# Altium footprint library SMD IC Packages.PcbLib: 345 footprints (part 26 of 36)
Each footprint in its own frame and in the unit in brackets; x right, y up, seen from the top. Pads: shape width x height; smd on the part's side, far side on the other; paste and mask are expansions set on the pad; w line width, h text height; cw(c..) or ccw(c..) is an arc to the next point about the centre after c.
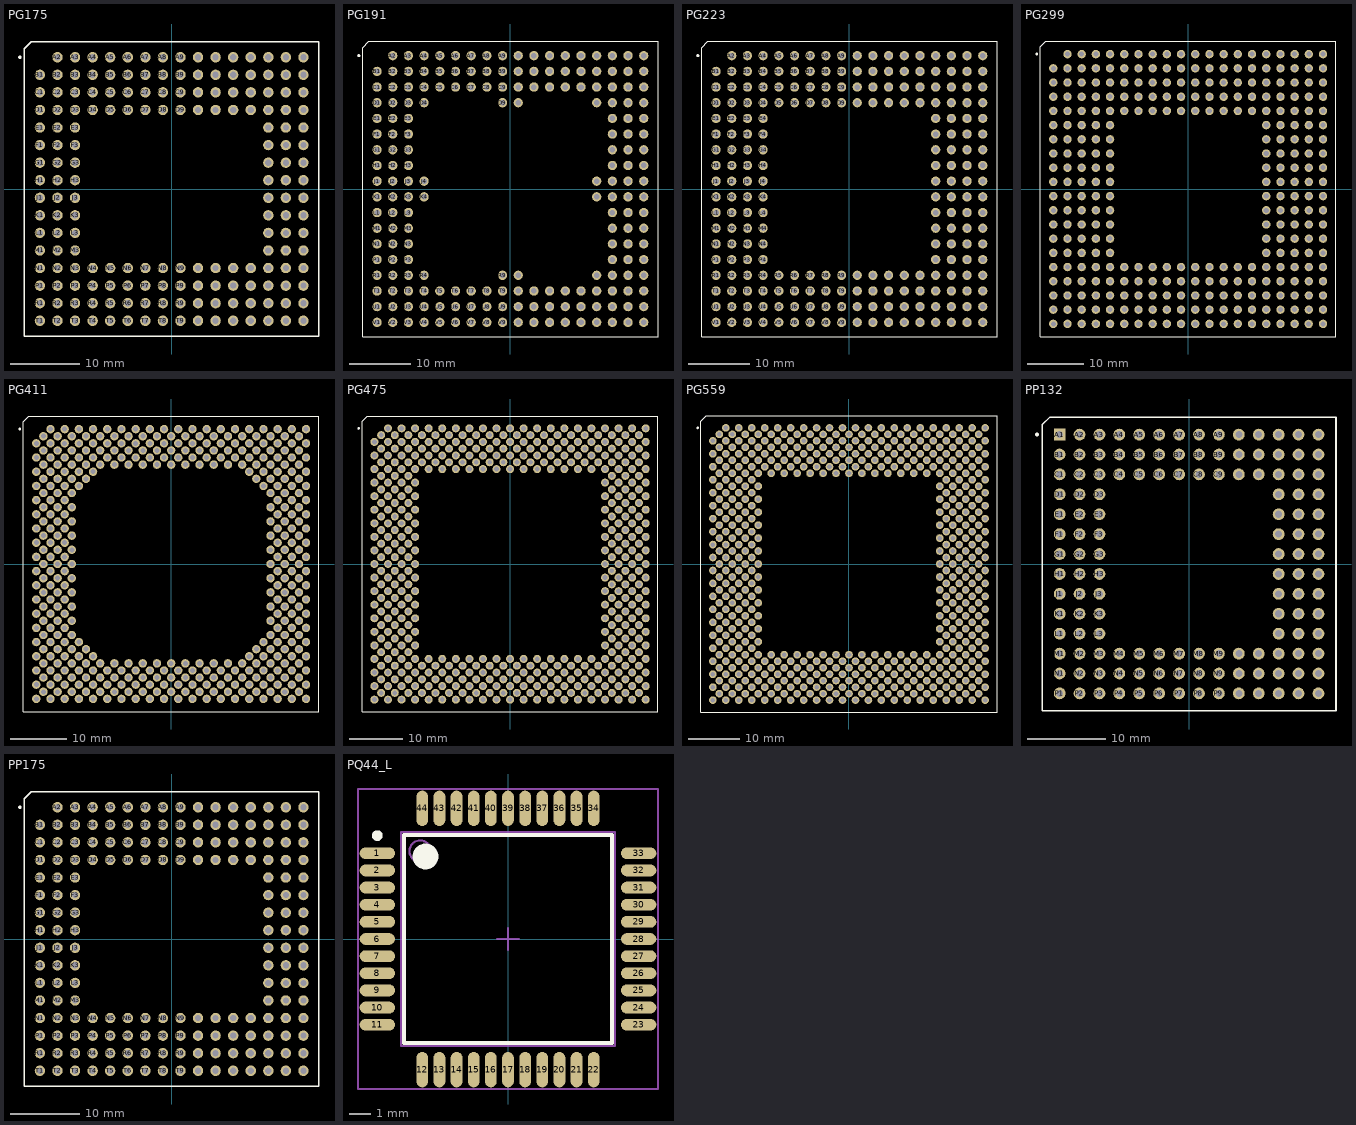
[diagram p25: the footprints below, top view; thin cyan lines are the x and y axes]

## PG175 [mm] "175-Pin Ceramic Pin Grid Array (PG175)"
height 5.21
pads (175):
  round 1.5 hole 0.9: A2(-16.51,19.05) A3(-13.97,19.05) A4(-11.43,19.05) A5(-8.89,19.05) A6(-6.35,19.05) A7(-3.81,19.05) A8(-1.27,19.05) A9(1.27,19.05) A10(3.81,19.05) A11(6.35,19.05) A12(8.89,19.05) A13(11.43,19.05) A14(13.97,19.05) A15(16.51,19.05) A16(19.05,19.05) B1(-19.05,16.51) B2(-16.51,16.51) B3(-13.97,16.51) B4(-11.43,16.51) B5(-8.89,16.51) B6(-6.35,16.51) B7(-3.81,16.51) B8(-1.27,16.51) B9(1.27,16.51) B10(3.81,16.51) B11(6.35,16.51) B12(8.89,16.51) B13(11.43,16.51) B14(13.97,16.51) B15(16.51,16.51) B16(19.05,16.51) C1(-19.05,13.97) C2(-16.51,13.97) C3(-13.97,13.97) C4(-11.43,13.97) C5(-8.89,13.97) C6(-6.35,13.97) C7(-3.81,13.97) C8(-1.27,13.97) C9(1.27,13.97) C10(3.81,13.97) C11(6.35,13.97) C12(8.89,13.97) C13(11.43,13.97) C14(13.97,13.97) C15(16.51,13.97) C16(19.05,13.97) D1(-19.05,11.43) D2(-16.51,11.43) D3(-13.97,11.43) D4(-11.43,11.43) D5(-8.89,11.43) D6(-6.35,11.43) D7(-3.81,11.43) D8(-1.27,11.43) D9(1.27,11.43) D10(3.81,11.43) D11(6.35,11.43) D12(8.89,11.43) D13(11.43,11.43) D14(13.97,11.43) D15(16.51,11.43) D16(19.05,11.43) E1(-19.05,8.89) E2(-16.51,8.89) E3(-13.97,8.89) E14(13.97,8.89) E15(16.51,8.89) E16(19.05,8.89) F1(-19.05,6.35) F2(-16.51,6.35) F3(-13.97,6.35) F14(13.97,6.35) F15(16.51,6.35) F16(19.05,6.35) G1(-19.05,3.81) G2(-16.51,3.81) G3(-13.97,3.81) G14(13.97,3.81) G15(16.51,3.81) G16(19.05,3.81) H1(-19.05,1.27) H2(-16.51,1.27) H3(-13.97,1.27) H14(13.97,1.27) H15(16.51,1.27) H16(19.05,1.27) J1(-19.05,-1.27) J2(-16.51,-1.27) J3(-13.97,-1.27) J14(13.97,-1.27) J15(16.51,-1.27) J16(19.05,-1.27) K1(-19.05,-3.81) K2(-16.51,-3.81) K3(-13.97,-3.81) K14(13.97,-3.81) K15(16.51,-3.81) K16(19.05,-3.81) L1(-19.05,-6.35) L2(-16.51,-6.35) L3(-13.97,-6.35) L14(13.97,-6.35) L15(16.51,-6.35) L16(19.05,-6.35) M1(-19.05,-8.89) M2(-16.51,-8.89) M3(-13.97,-8.89) M14(13.97,-8.89) M15(16.51,-8.89) M16(19.05,-8.89) N1(-19.05,-11.43) N2(-16.51,-11.43) N3(-13.97,-11.43) N4(-11.43,-11.43) N5(-8.89,-11.43) N6(-6.35,-11.43) N7(-3.81,-11.43) N8(-1.27,-11.43) N9(1.27,-11.43) N10(3.81,-11.43) N11(6.35,-11.43) N12(8.89,-11.43) N13(11.43,-11.43) N14(13.97,-11.43) N15(16.51,-11.43) N16(19.05,-11.43) P1(-19.05,-13.97) P2(-16.51,-13.97) P3(-13.97,-13.97) P4(-11.43,-13.97) P5(-8.89,-13.97) P6(-6.35,-13.97) P7(-3.81,-13.97) P8(-1.27,-13.97) P9(1.27,-13.97) P10(3.81,-13.97) P11(6.35,-13.97) P12(8.89,-13.97) P13(11.43,-13.97) P14(13.97,-13.97) P15(16.51,-13.97) P16(19.05,-13.97) R1(-19.05,-16.51) R2(-16.51,-16.51) R3(-13.97,-16.51) R4(-11.43,-16.51) R5(-8.89,-16.51) R6(-6.35,-16.51) R7(-3.81,-16.51) R8(-1.27,-16.51) R9(1.27,-16.51) R10(3.81,-16.51) R11(6.35,-16.51) R12(8.89,-16.51) R13(11.43,-16.51) R14(13.97,-16.51) R15(16.51,-16.51) R16(19.05,-16.51) T1(-19.05,-19.05) T2(-16.51,-19.05) T3(-13.97,-19.05) T4(-11.43,-19.05) T5(-8.89,-19.05) T6(-6.35,-19.05) T7(-3.81,-19.05) T8(-1.27,-19.05) T9(1.27,-19.05) T10(3.81,-19.05) T11(6.35,-19.05) T12(8.89,-19.05) T13(11.43,-19.05) T14(13.97,-19.05) T15(16.51,-19.05) T16(19.05,-19.05)
Top Overlay:
  circle w0.25: c-21.95,19.05 r0.125
  lines w0.2: -21.3,-21.3 -21.3,20.3 -20.3,21.3 21.3,21.3 21.3,-21.3 -21.3,-21.3

## PG191 [mm] "191-Pin Ceramic Pin Grid Array (PG191)"
height 5.21
pads (191):
  round 1.5 hole 0.9: A2(-19.05,21.59) A3(-16.51,21.59) A4(-13.97,21.59) A5(-11.43,21.59) A6(-8.89,21.59) A7(-6.35,21.59) A8(-3.81,21.59) A9(-1.27,21.59) A10(1.27,21.59) A11(3.81,21.59) A12(6.35,21.59) A13(8.89,21.59) A14(11.43,21.59) A15(13.97,21.59) A16(16.51,21.59) A17(19.05,21.59) A18(21.59,21.59) B1(-21.59,19.05) B2(-19.05,19.05) B3(-16.51,19.05) B4(-13.97,19.05) B5(-11.43,19.05) B6(-8.89,19.05) B7(-6.35,19.05) B8(-3.81,19.05) B9(-1.27,19.05) B10(1.27,19.05) B11(3.81,19.05) B12(6.35,19.05) B13(8.89,19.05) B14(11.43,19.05) B15(13.97,19.05) B16(16.51,19.05) B17(19.05,19.05) B18(21.59,19.05) C1(-21.59,16.51) C2(-19.05,16.51) C3(-16.51,16.51) C4(-13.97,16.51) C5(-11.43,16.51) C6(-8.89,16.51) C7(-6.35,16.51) C8(-3.81,16.51) C9(-1.27,16.51) C10(1.27,16.51) C11(3.81,16.51) C12(6.35,16.51) C13(8.89,16.51) C14(11.43,16.51) C15(13.97,16.51) C16(16.51,16.51) C17(19.05,16.51) C18(21.59,16.51) D1(-21.59,13.97) D2(-19.05,13.97) D3(-16.51,13.97) D4(-13.97,13.97) D9(-1.27,13.97) D10(1.27,13.97) D15(13.97,13.97) D16(16.51,13.97) D17(19.05,13.97) D18(21.59,13.97) E1(-21.59,11.43) E2(-19.05,11.43) E3(-16.51,11.43) E16(16.51,11.43) E17(19.05,11.43) E18(21.59,11.43) F1(-21.59,8.89) F2(-19.05,8.89) F3(-16.51,8.89) F16(16.51,8.89) F17(19.05,8.89) F18(21.59,8.89) G1(-21.59,6.35) G2(-19.05,6.35) G3(-16.51,6.35) G16(16.51,6.35) G17(19.05,6.35) G18(21.59,6.35) H1(-21.59,3.81) H2(-19.05,3.81) H3(-16.51,3.81) H16(16.51,3.81) H17(19.05,3.81) H18(21.59,3.81) J1(-21.59,1.27) J2(-19.05,1.27) J3(-16.51,1.27) J4(-13.97,1.27) J15(13.97,1.27) J16(16.51,1.27) J17(19.05,1.27) J18(21.59,1.27) K1(-21.59,-1.27) K2(-19.05,-1.27) K3(-16.51,-1.27) K4(-13.97,-1.27) K15(13.97,-1.27) K16(16.51,-1.27) K17(19.05,-1.27) K18(21.59,-1.27) L1(-21.59,-3.81) L2(-19.05,-3.81) L3(-16.51,-3.81) L16(16.51,-3.81) L17(19.05,-3.81) L18(21.59,-3.81) M1(-21.59,-6.35) M2(-19.05,-6.35) M3(-16.51,-6.35) M16(16.51,-6.35) M17(19.05,-6.35) M18(21.59,-6.35) N1(-21.59,-8.89) N2(-19.05,-8.89) N3(-16.51,-8.89) N16(16.51,-8.89) N17(19.05,-8.89) N18(21.59,-8.89) P1(-21.59,-11.43) P2(-19.05,-11.43) P3(-16.51,-11.43) P16(16.51,-11.43) P17(19.05,-11.43) P18(21.59,-11.43) R1(-21.59,-13.97) R2(-19.05,-13.97) R3(-16.51,-13.97) R4(-13.97,-13.97) R9(-1.27,-13.97) R10(1.27,-13.97) R15(13.97,-13.97) R16(16.51,-13.97) R17(19.05,-13.97) R18(21.59,-13.97) T1(-21.59,-16.51) T2(-19.05,-16.51) T3(-16.51,-16.51) T4(-13.97,-16.51) T5(-11.43,-16.51) T6(-8.89,-16.51) T7(-6.35,-16.51) T8(-3.81,-16.51) T9(-1.27,-16.51) T10(1.27,-16.51) T11(3.81,-16.51) T12(6.35,-16.51) T13(8.89,-16.51) T14(11.43,-16.51) T15(13.97,-16.51) T16(16.51,-16.51) T17(19.05,-16.51) T18(21.59,-16.51) U1(-21.59,-19.05) U2(-19.05,-19.05) U3(-16.51,-19.05) U4(-13.97,-19.05) U5(-11.43,-19.05) U6(-8.89,-19.05) U7(-6.35,-19.05) U8(-3.81,-19.05) U9(-1.27,-19.05) U10(1.27,-19.05) U11(3.81,-19.05) U12(6.35,-19.05) U13(8.89,-19.05) U14(11.43,-19.05) U15(13.97,-19.05) U16(16.51,-19.05) U17(19.05,-19.05) U18(21.59,-19.05) V1(-21.59,-21.59) V2(-19.05,-21.59) V3(-16.51,-21.59) V4(-13.97,-21.59) V5(-11.43,-21.59) V6(-8.89,-21.59) V7(-6.35,-21.59) V8(-3.81,-21.59) V9(-1.27,-21.59) V10(1.27,-21.59) V11(3.81,-21.59) V12(6.35,-21.59) V13(8.89,-21.59) V14(11.43,-21.59) V15(13.97,-21.59) V16(16.51,-21.59) V17(19.05,-21.59) V18(21.59,-21.59)
Top Overlay:
  circle w0.25: c-24.55,21.59 r0.125
  lines w0.2: -23.9,-23.9 23.9,-23.9 23.9,23.9 -22.9,23.9 -23.9,22.9 -23.9,-23.9

## PG223 [mm] "223-Pin Ceramic Pin Grid Array (PG223)"
height 5.21
pads (223):
  round 1.5 hole 0.9: A2(-19.05,21.59) A3(-16.51,21.59) A4(-13.97,21.59) A5(-11.43,21.59) A6(-8.89,21.59) A7(-6.35,21.59) A8(-3.81,21.59) A9(-1.27,21.59) A10(1.27,21.59) A11(3.81,21.59) A12(6.35,21.59) A13(8.89,21.59) A14(11.43,21.59) A15(13.97,21.59) A16(16.51,21.59) A17(19.05,21.59) A18(21.59,21.59) B1(-21.59,19.05) B2(-19.05,19.05) B3(-16.51,19.05) B4(-13.97,19.05) B5(-11.43,19.05) B6(-8.89,19.05) B7(-6.35,19.05) B8(-3.81,19.05) B9(-1.27,19.05) B10(1.27,19.05) B11(3.81,19.05) B12(6.35,19.05) B13(8.89,19.05) B14(11.43,19.05) B15(13.97,19.05) B16(16.51,19.05) B17(19.05,19.05) B18(21.59,19.05) C1(-21.59,16.51) C2(-19.05,16.51) C3(-16.51,16.51) C4(-13.97,16.51) C5(-11.43,16.51) C6(-8.89,16.51) C7(-6.35,16.51) C8(-3.81,16.51) C9(-1.27,16.51) C10(1.27,16.51) C11(3.81,16.51) C12(6.35,16.51) C13(8.89,16.51) C14(11.43,16.51) C15(13.97,16.51) C16(16.51,16.51) C17(19.05,16.51) C18(21.59,16.51) D1(-21.59,13.97) D2(-19.05,13.97) D3(-16.51,13.97) D4(-13.97,13.97) D5(-11.43,13.97) D6(-8.89,13.97) D7(-6.35,13.97) D8(-3.81,13.97) D9(-1.27,13.97) D10(1.27,13.97) D11(3.81,13.97) D12(6.35,13.97) D13(8.89,13.97) D14(11.43,13.97) D15(13.97,13.97) D16(16.51,13.97) D17(19.05,13.97) D18(21.59,13.97) E1(-21.59,11.43) E2(-19.05,11.43) E3(-16.51,11.43) E4(-13.97,11.43) E15(13.97,11.43) E16(16.51,11.43) E17(19.05,11.43) E18(21.59,11.43) F1(-21.59,8.89) F2(-19.05,8.89) F3(-16.51,8.89) F4(-13.97,8.89) F15(13.97,8.89) F16(16.51,8.89) F17(19.05,8.89) F18(21.59,8.89) G1(-21.59,6.35) G2(-19.05,6.35) G3(-16.51,6.35) G4(-13.97,6.35) G15(13.97,6.35) G16(16.51,6.35) G17(19.05,6.35) G18(21.59,6.35) H1(-21.59,3.81) H2(-19.05,3.81) H3(-16.51,3.81) H4(-13.97,3.81) H15(13.97,3.81) H16(16.51,3.81) H17(19.05,3.81) H18(21.59,3.81) J1(-21.59,1.27) J2(-19.05,1.27) J3(-16.51,1.27) J4(-13.97,1.27) J15(13.97,1.27) J16(16.51,1.27) J17(19.05,1.27) J18(21.59,1.27) K1(-21.59,-1.27) K2(-19.05,-1.27) K3(-16.51,-1.27) K4(-13.97,-1.27) K15(13.97,-1.27) K16(16.51,-1.27) K17(19.05,-1.27) K18(21.59,-1.27) L1(-21.59,-3.81) L2(-19.05,-3.81) L3(-16.51,-3.81) L4(-13.97,-3.81) L15(13.97,-3.81) L16(16.51,-3.81) L17(19.05,-3.81) L18(21.59,-3.81) M1(-21.59,-6.35) M2(-19.05,-6.35) M3(-16.51,-6.35) M4(-13.97,-6.35) M15(13.97,-6.35) M16(16.51,-6.35) M17(19.05,-6.35) M18(21.59,-6.35) N1(-21.59,-8.89) N2(-19.05,-8.89) N3(-16.51,-8.89) N4(-13.97,-8.89) N15(13.97,-8.89) N16(16.51,-8.89) N17(19.05,-8.89) N18(21.59,-8.89) P1(-21.59,-11.43) P2(-19.05,-11.43) P3(-16.51,-11.43) P4(-13.97,-11.43) P15(13.97,-11.43) P16(16.51,-11.43) P17(19.05,-11.43) P18(21.59,-11.43) R1(-21.59,-13.97) R2(-19.05,-13.97) R3(-16.51,-13.97) R4(-13.97,-13.97) R5(-11.43,-13.97) R6(-8.89,-13.97) R7(-6.35,-13.97) R8(-3.81,-13.97) R9(-1.27,-13.97) R10(1.27,-13.97) R11(3.81,-13.97) R12(6.35,-13.97) R13(8.89,-13.97) R14(11.43,-13.97) R15(13.97,-13.97) R16(16.51,-13.97) R17(19.05,-13.97) R18(21.59,-13.97) T1(-21.59,-16.51) T2(-19.05,-16.51) T3(-16.51,-16.51) T4(-13.97,-16.51) T5(-11.43,-16.51) T6(-8.89,-16.51) T7(-6.35,-16.51) T8(-3.81,-16.51) T9(-1.27,-16.51) T10(1.27,-16.51) T11(3.81,-16.51) T12(6.35,-16.51) T13(8.89,-16.51) T14(11.43,-16.51) T15(13.97,-16.51) T16(16.51,-16.51) T17(19.05,-16.51) T18(21.59,-16.51) U1(-21.59,-19.05) U2(-19.05,-19.05) U3(-16.51,-19.05) U4(-13.97,-19.05) U5(-11.43,-19.05) U6(-8.89,-19.05) U7(-6.35,-19.05) U8(-3.81,-19.05) U9(-1.27,-19.05) U10(1.27,-19.05) U11(3.81,-19.05) U12(6.35,-19.05) U13(8.89,-19.05) U14(11.43,-19.05) U15(13.97,-19.05) U16(16.51,-19.05) U17(19.05,-19.05) U18(21.59,-19.05) V1(-21.59,-21.59) V2(-19.05,-21.59) V3(-16.51,-21.59) V4(-13.97,-21.59) V5(-11.43,-21.59) V6(-8.89,-21.59) V7(-6.35,-21.59) V8(-3.81,-21.59) V9(-1.27,-21.59) V10(1.27,-21.59) V11(3.81,-21.59) V12(6.35,-21.59) V13(8.89,-21.59) V14(11.43,-21.59) V15(13.97,-21.59) V16(16.51,-21.59) V17(19.05,-21.59) V18(21.59,-21.59)
Top Overlay:
  circle w0.25: c-24.55,21.59 r0.125
  lines w0.2: -23.9,-23.9 23.9,-23.9 23.9,23.9 -22.9,23.9 -23.9,22.9 -23.9,-23.9

## PG299 [mm] "299-Pin Ceramic Pin Grid Array (PG299)"
height 5.21
pads (299):
  round 1.5 hole 0.9: A2(-21.59,24.13) A3(-19.05,24.13) A4(-16.51,24.13) A5(-13.97,24.13) A6(-11.43,24.13) A7(-8.89,24.13) A8(-6.35,24.13) A9(-3.81,24.13) A10(-1.27,24.13) A11(1.27,24.13) A12(3.81,24.13) A13(6.35,24.13) A14(8.89,24.13) A15(11.43,24.13) A16(13.97,24.13) A17(16.51,24.13) A18(19.05,24.13) A19(21.59,24.13) A20(24.13,24.13) B1(-24.13,21.59) B2(-21.59,21.59) B3(-19.05,21.59) B4(-16.51,21.59) B5(-13.97,21.59) B6(-11.43,21.59) B7(-8.89,21.59) B8(-6.35,21.59) B9(-3.81,21.59) B10(-1.27,21.59) B11(1.27,21.59) B12(3.81,21.59) B13(6.35,21.59) B14(8.89,21.59) B15(11.43,21.59) B16(13.97,21.59) B17(16.51,21.59) B18(19.05,21.59) B19(21.59,21.59) B20(24.13,21.59) C1(-24.13,19.05) C2(-21.59,19.05) C3(-19.05,19.05) C4(-16.51,19.05) C5(-13.97,19.05) C6(-11.43,19.05) C7(-8.89,19.05) C8(-6.35,19.05) C9(-3.81,19.05) C10(-1.27,19.05) C11(1.27,19.05) C12(3.81,19.05) C13(6.35,19.05) C14(8.89,19.05) C15(11.43,19.05) C16(13.97,19.05) C17(16.51,19.05) C18(19.05,19.05) C19(21.59,19.05) C20(24.13,19.05) D1(-24.13,16.51) D2(-21.59,16.51) D3(-19.05,16.51) D4(-16.51,16.51) D5(-13.97,16.51) D6(-11.43,16.51) D7(-8.89,16.51) D8(-6.35,16.51) D9(-3.81,16.51) D10(-1.27,16.51) D11(1.27,16.51) D12(3.81,16.51) D13(6.35,16.51) D14(8.89,16.51) D15(11.43,16.51) D16(13.97,16.51) D17(16.51,16.51) D18(19.05,16.51) D19(21.59,16.51) D20(24.13,16.51) E1(-24.13,13.97) E2(-21.59,13.97) E3(-19.05,13.97) E4(-16.51,13.97) E5(-13.97,13.97) E6(-11.43,13.97) E7(-8.89,13.97) E8(-6.35,13.97) E9(-3.81,13.97) E10(-1.27,13.97) E11(1.27,13.97) E12(3.81,13.97) E13(6.35,13.97) E14(8.89,13.97) E15(11.43,13.97) E16(13.97,13.97) E17(16.51,13.97) E18(19.05,13.97) E19(21.59,13.97) E20(24.13,13.97) F1(-24.13,11.43) F2(-21.59,11.43) F3(-19.05,11.43) F4(-16.51,11.43) F5(-13.97,11.43) F16(13.97,11.43) F17(16.51,11.43) F18(19.05,11.43) F19(21.59,11.43) F20(24.13,11.43) G1(-24.13,8.89) G2(-21.59,8.89) G3(-19.05,8.89) G4(-16.51,8.89) G5(-13.97,8.89) G16(13.97,8.89) G17(16.51,8.89) G18(19.05,8.89) G19(21.59,8.89) G20(24.13,8.89) H1(-24.13,6.35) H2(-21.59,6.35) H3(-19.05,6.35) H4(-16.51,6.35) H5(-13.97,6.35) H16(13.97,6.35) H17(16.51,6.35) H18(19.05,6.35) H19(21.59,6.35) H20(24.13,6.35) J1(-24.13,3.81) J2(-21.59,3.81) J3(-19.05,3.81) J4(-16.51,3.81) J5(-13.97,3.81) J16(13.97,3.81) J17(16.51,3.81) J18(19.05,3.81) J19(21.59,3.81) J20(24.13,3.81) K1(-24.13,1.27) K2(-21.59,1.27) K3(-19.05,1.27) K4(-16.51,1.27) K5(-13.97,1.27) K16(13.97,1.27) K17(16.51,1.27) K18(19.05,1.27) K19(21.59,1.27) K20(24.13,1.27) L1(-24.13,-1.27) L2(-21.59,-1.27) L3(-19.05,-1.27) L4(-16.51,-1.27) L5(-13.97,-1.27) L16(13.97,-1.27) L17(16.51,-1.27) L18(19.05,-1.27) L19(21.59,-1.27) L20(24.13,-1.27) M1(-24.13,-3.81) M2(-21.59,-3.81) M3(-19.05,-3.81) M4(-16.51,-3.81) M5(-13.97,-3.81) M16(13.97,-3.81) M17(16.51,-3.81) M18(19.05,-3.81) M19(21.59,-3.81) M20(24.13,-3.81) N1(-24.13,-6.35) N2(-21.59,-6.35) N3(-19.05,-6.35) N4(-16.51,-6.35) N5(-13.97,-6.35) N16(13.97,-6.35) N17(16.51,-6.35) N18(19.05,-6.35) N19(21.59,-6.35) N20(24.13,-6.35) P1(-24.13,-8.89) P2(-21.59,-8.89) P3(-19.05,-8.89) P4(-16.51,-8.89) P5(-13.97,-8.89) P16(13.97,-8.89) P17(16.51,-8.89) P18(19.05,-8.89) P19(21.59,-8.89) P20(24.13,-8.89) R1(-24.13,-11.43) R2(-21.59,-11.43) R3(-19.05,-11.43) R4(-16.51,-11.43) R5(-13.97,-11.43) R16(13.97,-11.43) R17(16.51,-11.43) R18(19.05,-11.43) R19(21.59,-11.43) R20(24.13,-11.43) T1(-24.13,-13.97) T2(-21.59,-13.97) T3(-19.05,-13.97) T4(-16.51,-13.97) T5(-13.97,-13.97) T6(-11.43,-13.97) T7(-8.89,-13.97) T8(-6.35,-13.97) T9(-3.81,-13.97) T10(-1.27,-13.97) T11(1.27,-13.97) T12(3.81,-13.97) T13(6.35,-13.97) T14(8.89,-13.97) T15(11.43,-13.97) T16(13.97,-13.97) T17(16.51,-13.97) T18(19.05,-13.97) T19(21.59,-13.97) T20(24.13,-13.97) U1(-24.13,-16.51) U2(-21.59,-16.51) U3(-19.05,-16.51) U4(-16.51,-16.51) U5(-13.97,-16.51) U6(-11.43,-16.51) U7(-8.89,-16.51) U8(-6.35,-16.51) U9(-3.81,-16.51) U10(-1.27,-16.51) U11(1.27,-16.51) U12(3.81,-16.51) U13(6.35,-16.51) U14(8.89,-16.51) U15(11.43,-16.51) U16(13.97,-16.51) U17(16.51,-16.51) U18(19.05,-16.51) U19(21.59,-16.51) U20(24.13,-16.51) V1(-24.13,-19.05) V2(-21.59,-19.05) V3(-19.05,-19.05) V4(-16.51,-19.05) V5(-13.97,-19.05) V6(-11.43,-19.05) V7(-8.89,-19.05) V8(-6.35,-19.05) V9(-3.81,-19.05) V10(-1.27,-19.05) V11(1.27,-19.05) V12(3.81,-19.05) V13(6.35,-19.05) V14(8.89,-19.05) V15(11.43,-19.05) V16(13.97,-19.05) V17(16.51,-19.05) V18(19.05,-19.05) V19(21.59,-19.05) V20(24.13,-19.05) W1(-24.13,-21.59) W2(-21.59,-21.59) W3(-19.05,-21.59) W4(-16.51,-21.59) W5(-13.97,-21.59) W6(-11.43,-21.59) W7(-8.89,-21.59) W8(-6.35,-21.59) W9(-3.81,-21.59) W10(-1.27,-21.59) W11(1.27,-21.59) W12(3.81,-21.59) W13(6.35,-21.59) W14(8.89,-21.59) W15(11.43,-21.59) W16(13.97,-21.59) W17(16.51,-21.59) W18(19.05,-21.59) W19(21.59,-21.59) W20(24.13,-21.59) X1(-24.13,-24.13) X2(-21.59,-24.13) X3(-19.05,-24.13) X4(-16.51,-24.13) X5(-13.97,-24.13) X6(-11.43,-24.13) X7(-8.89,-24.13) X8(-6.35,-24.13) X9(-3.81,-24.13) X10(-1.27,-24.13) X11(1.27,-24.13) X12(3.81,-24.13) X13(6.35,-24.13) X14(8.89,-24.13) X15(11.43,-24.13) X16(13.97,-24.13) X17(16.51,-24.13) X18(19.05,-24.13) X19(21.558,-24.142) X20(24.13,-24.13)
Top Overlay:
  circle w0.25: c-27.1,24.13 r0.125
  lines w0.2: -26.45,-26.45 26.45,-26.45 26.45,26.45 -25.45,26.45 -26.45,25.45 -26.45,-26.45

## PG411 [mm] "411-Pin Ceramic Pin Grid Array (PG411)"
height 5.86
pads (411):
  round 1.5 hole 0.9: A3(-21.59,24.13) A5(-19.05,24.13) A7(-16.51,24.13) A9(-13.97,24.13) A11(-11.43,24.13) A13(-8.89,24.13) A15(-6.35,24.13) A17(-3.81,24.13) A19(-1.27,24.13) A21(1.27,24.13) A23(3.81,24.13) A25(6.35,24.13) A27(8.89,24.13) A29(11.43,24.13) A31(13.97,24.13) A33(16.51,24.13) A35(19.05,24.13) A37(21.59,24.13) A39(24.13,24.13) AA1(-24.13,-1.27) AA3(-21.59,-1.27) AA5(-19.05,-1.27) AA35(19.05,-1.27) AA37(21.59,-1.27) AA39(24.13,-1.27) AB2(-22.86,-2.54) AB4(-20.32,-2.54) AB6(-17.78,-2.54) AB34(17.78,-2.54) AB36(20.32,-2.54) AB38(22.86,-2.54) AC1(-24.13,-3.81) AC3(-21.59,-3.81) AC5(-19.05,-3.81) AC35(19.05,-3.81) AC37(21.59,-3.81) AC39(24.13,-3.81) AD2(-22.86,-5.08) AD4(-20.32,-5.08) AD6(-17.78,-5.08) AD34(17.78,-5.08) AD36(20.32,-5.08) AD38(22.86,-5.08) AE1(-24.13,-6.35) AE3(-21.59,-6.35) AE5(-19.05,-6.35) AE35(19.05,-6.35) AE37(21.59,-6.35) AE39(24.13,-6.35) AF2(-22.86,-7.62) AF4(-20.32,-7.62) AF6(-17.78,-7.62) AF34(17.78,-7.62) AF36(20.32,-7.62) AF38(22.86,-7.62) AG1(-24.13,-8.89) AG3(-21.59,-8.89) AG5(-19.05,-8.89) AG35(19.05,-8.89) AG37(21.59,-8.89) AG39(24.13,-8.89) AH2(-22.86,-10.16) AH4(-20.32,-10.16) AH6(-17.78,-10.16) AH34(17.78,-10.16) AH36(20.32,-10.16) AH38(22.86,-10.16) AJ1(-24.13,-11.43) AJ3(-21.59,-11.43) AJ5(-19.05,-11.43) AJ35(19.05,-11.43) AJ37(21.59,-11.43) AJ39(24.13,-11.43) AK2(-22.86,-12.7) AK4(-20.32,-12.7) AK6(-17.78,-12.7) AK34(17.78,-12.7) AK36(20.32,-12.7) AK38(22.86,-12.7) AL1(-24.13,-13.97) AL3(-21.59,-13.97) AL5(-19.05,-13.97) AL7(-16.51,-13.97) AL33(16.51,-13.97) AL35(19.05,-13.97) AL37(21.59,-13.97) AL39(24.13,-13.97) AM2(-22.86,-15.24) AM4(-20.32,-15.24) AM6(-17.78,-15.24) AM8(-15.24,-15.24) AM32(15.24,-15.24) AM34(17.78,-15.24) AM36(20.32,-15.24) AM38(22.86,-15.24) AN1(-24.13,-16.51) AN3(-21.59,-16.51) AN5(-19.05,-16.51) AN7(-16.51,-16.51) AN9(-13.97,-16.51) AN31(13.97,-16.51) AN33(16.51,-16.51) AN35(19.05,-16.51) AN37(21.59,-16.51) AN39(24.13,-16.51) AP2(-22.86,-17.78) AP4(-20.32,-17.78) AP6(-17.78,-17.78) AP8(-15.24,-17.78) AP10(-12.7,-17.78) AP12(-10.16,-17.78) AP14(-7.62,-17.78) AP16(-5.08,-17.78) AP18(-2.54,-17.78) AP20(0,-17.78) AP22(2.54,-17.78) AP24(5.08,-17.78) AP26(7.62,-17.78) AP28(10.16,-17.78) AP30(12.7,-17.78) AP32(15.24,-17.78) AP34(17.78,-17.78) AP36(20.32,-17.78) AP38(22.86,-17.78) AR1(-24.13,-19.05) AR3(-21.59,-19.05) AR5(-19.05,-19.05) AR7(-16.51,-19.05) AR9(-13.97,-19.05) AR11(-11.43,-19.05) AR13(-8.89,-19.05) AR15(-6.35,-19.05) AR17(-3.81,-19.05) AR19(-1.27,-19.05) AR21(1.27,-19.05) AR23(3.81,-19.05) AR25(6.35,-19.05) AR27(8.89,-19.05) AR29(11.43,-19.05) AR31(13.97,-19.05) AR33(16.51,-19.05) AR35(19.05,-19.05) AR37(21.59,-19.05) AR39(24.13,-19.05) AT2(-22.86,-20.32) AT4(-20.32,-20.32) AT6(-17.78,-20.32) AT8(-15.24,-20.32) AT10(-12.7,-20.32) AT12(-10.16,-20.32) AT14(-7.62,-20.32) AT16(-5.08,-20.32) AT18(-2.54,-20.32) AT20(0,-20.32) AT22(2.54,-20.32) AT24(5.08,-20.32) AT26(7.62,-20.32) AT28(10.16,-20.32) AT30(12.7,-20.32) AT32(15.24,-20.32) AT34(17.78,-20.32) AT36(20.32,-20.32) AT38(22.86,-20.32) AU1(-24.13,-21.59) AU3(-21.59,-21.59) AU5(-19.05,-21.59) AU7(-16.51,-21.59) AU9(-13.97,-21.59) AU11(-11.43,-21.59) AU13(-8.89,-21.59) AU15(-6.35,-21.59) AU17(-3.81,-21.59) AU19(-1.27,-21.59) AU21(1.27,-21.59) AU23(3.81,-21.59) AU25(6.35,-21.59) AU27(8.89,-21.59) AU29(11.43,-21.59) AU31(13.97,-21.59) AU33(16.51,-21.59) AU35(19.05,-21.59) AU37(21.59,-21.59) AU39(24.13,-21.59) AV2(-22.86,-22.86) AV4(-20.32,-22.86) AV6(-17.78,-22.86) AV8(-15.24,-22.86) AV10(-12.7,-22.86) AV12(-10.16,-22.86) AV14(-7.62,-22.86) AV16(-5.08,-22.86) AV18(-2.54,-22.86) AV20(0,-22.86) AV22(2.54,-22.86) AV24(5.08,-22.86) AV26(7.62,-22.86) AV28(10.16,-22.86) AV30(12.7,-22.86) AV32(15.24,-22.86) AV34(17.78,-22.86) AV36(20.32,-22.86) AV38(22.86,-22.86) AW1(-24.13,-24.13) AW3(-21.59,-24.13) AW5(-19.05,-24.13) AW7(-16.51,-24.13) AW9(-13.97,-24.13) AW11(-11.43,-24.13) AW13(-8.89,-24.13) AW15(-6.35,-24.13) AW17(-3.81,-24.13) AW19(-1.27,-24.13) AW21(1.27,-24.13) AW23(3.81,-24.13) AW25(6.35,-24.13) AW27(8.89,-24.13) AW29(11.43,-24.13) AW31(13.97,-24.13) AW33(16.51,-24.13) AW35(19.05,-24.13) AW37(21.59,-24.13) AW39(24.13,-24.13) B2(-22.86,22.86) B4(-20.32,22.86) B6(-17.78,22.86) B8(-15.24,22.86) B10(-12.7,22.86) B12(-10.16,22.86) B14(-7.62,22.86) B16(-5.08,22.86) B18(-2.54,22.86) B20(0,22.86) B22(2.54,22.86) B24(5.08,22.86) B26(7.62,22.86) B28(10.16,22.86) B30(12.7,22.86) B32(15.24,22.86) B34(17.78,22.86) B36(20.32,22.86) B38(22.86,22.86) C1(-24.13,21.59) C3(-21.59,21.59) C5(-19.05,21.59) C7(-16.51,21.59) C9(-13.97,21.59) C11(-11.43,21.59) C13(-8.89,21.59) C15(-6.35,21.59) C17(-3.81,21.59) C19(-1.27,21.59) C21(1.27,21.59) C23(3.81,21.59) C25(6.35,21.59) C27(8.89,21.59) C29(11.43,21.59) C31(13.97,21.59) C33(16.51,21.59) C35(19.05,21.59) C37(21.59,21.59) C39(24.13,21.59) D2(-22.86,20.32) D4(-20.32,20.32) D6(-17.78,20.32) D8(-15.24,20.32) D10(-12.7,20.32) D12(-10.16,20.32) D14(-7.62,20.32) D16(-5.08,20.32) D18(-2.54,20.32) D20(0,20.32) D22(2.54,20.32) D24(5.08,20.32) D26(7.62,20.32) D28(10.16,20.32) D30(12.7,20.32) D32(15.24,20.32) D34(17.78,20.32) D36(20.32,20.32) D38(22.86,20.32) E1(-24.13,19.05) E3(-21.59,19.05) E5(-19.05,19.05) E7(-16.51,19.05) E9(-13.97,19.05) E11(-11.43,19.05) E13(-8.89,19.05) E15(-6.35,19.05) E17(-3.81,19.05) E19(-1.27,19.05) E21(1.27,19.05) E23(3.81,19.05) E25(6.35,19.05) E27(8.89,19.05) E29(11.43,19.05) E31(13.97,19.05) E33(16.51,19.05) E35(19.05,19.05) E37(21.59,19.05) E39(24.13,19.05) F2(-22.86,17.78) F4(-20.32,17.78) F6(-17.78,17.78) F8(-15.24,17.78) F10(-12.7,17.78) F12(-10.16,17.78) F14(-7.62,17.78) F16(-5.08,17.78) F18(-2.54,17.78) F20(0,17.78) F22(2.54,17.78) F24(5.08,17.78) F26(7.62,17.78) F28(10.16,17.78) F30(12.7,17.78) F32(15.24,17.78) F34(17.78,17.78) F36(20.32,17.78) F38(22.86,17.78) G1(-24.13,16.51) G3(-21.59,16.51) G5(-19.05,16.51) G7(-16.51,16.51) G9(-13.97,16.51) G31(13.97,16.51) G33(16.51,16.51) G35(19.05,16.51) G37(21.59,16.51) G39(24.13,16.51) H2(-22.86,15.24) H4(-20.32,15.24) H6(-17.78,15.24) H8(-15.24,15.24) H32(15.24,15.24) H34(17.78,15.24) H36(20.32,15.24) H38(22.86,15.24) J1(-24.13,13.97) J3(-21.59,13.97) J5(-19.05,13.97) J7(-16.51,13.97) J33(16.51,13.97) J35(19.05,13.97) J37(21.59,13.97) J39(24.13,13.97) K2(-22.86,12.7) K4(-20.32,12.7) K6(-17.78,12.7) K34(17.78,12.7) K36(20.32,12.7) K38(22.86,12.7) L1(-24.13,11.43) L3(-21.59,11.43) L5(-19.05,11.43) L35(19.05,11.43) L37(21.59,11.43) L39(24.13,11.43) M2(-22.86,10.16) M4(-20.32,10.16) M6(-17.78,10.16) M34(17.78,10.16) M36(20.32,10.16) M38(22.86,10.16) N1(-24.13,8.89) N3(-21.59,8.89) N5(-19.05,8.89) N35(19.05,8.89) N37(21.59,8.89) N39(24.13,8.89) P2(-22.86,7.62) P4(-20.32,7.62) P6(-17.78,7.62) P34(17.78,7.62) P36(20.32,7.62) P38(22.86,7.62) R1(-24.13,6.35) R3(-21.59,6.35) R5(-19.05,6.35) R35(19.05,6.35) R37(21.59,6.35) R39(24.13,6.35) T2(-22.86,5.08) T4(-20.32,5.08) T6(-17.78,5.08) T34(17.78,5.08) T36(20.32,5.08) T38(22.86,5.08) U1(-24.13,3.81) U3(-21.59,3.81) U5(-19.05,3.81) U35(19.05,3.81) U37(21.59,3.81) U39(24.13,3.81) V2(-22.86,2.54) V4(-20.32,2.54) V6(-17.78,2.54) V34(17.78,2.54) V36(20.32,2.54) V38(22.86,2.54) W1(-24.13,1.27) W3(-21.59,1.27) W5(-19.05,1.27) W35(19.05,1.27) W37(21.59,1.27) W39(24.13,1.27) Y2(-22.86,0) Y4(-20.32,0) Y6(-17.78,0) Y34(17.78,0) Y36(20.32,0) Y38(22.86,0)